# Altium footprint library ref-packages.PCBLIB: 1543 footprints (part 15 of 103)
Each footprint in its own frame and in the unit in brackets; x right, y up, seen from the top. Pads: shape width x height; smd on the part's side, far side on the other; paste and mask are expansions set on the pad; w line width, h text height; cw(c..) or ccw(c..) is an arc to the next point about the centre after c.
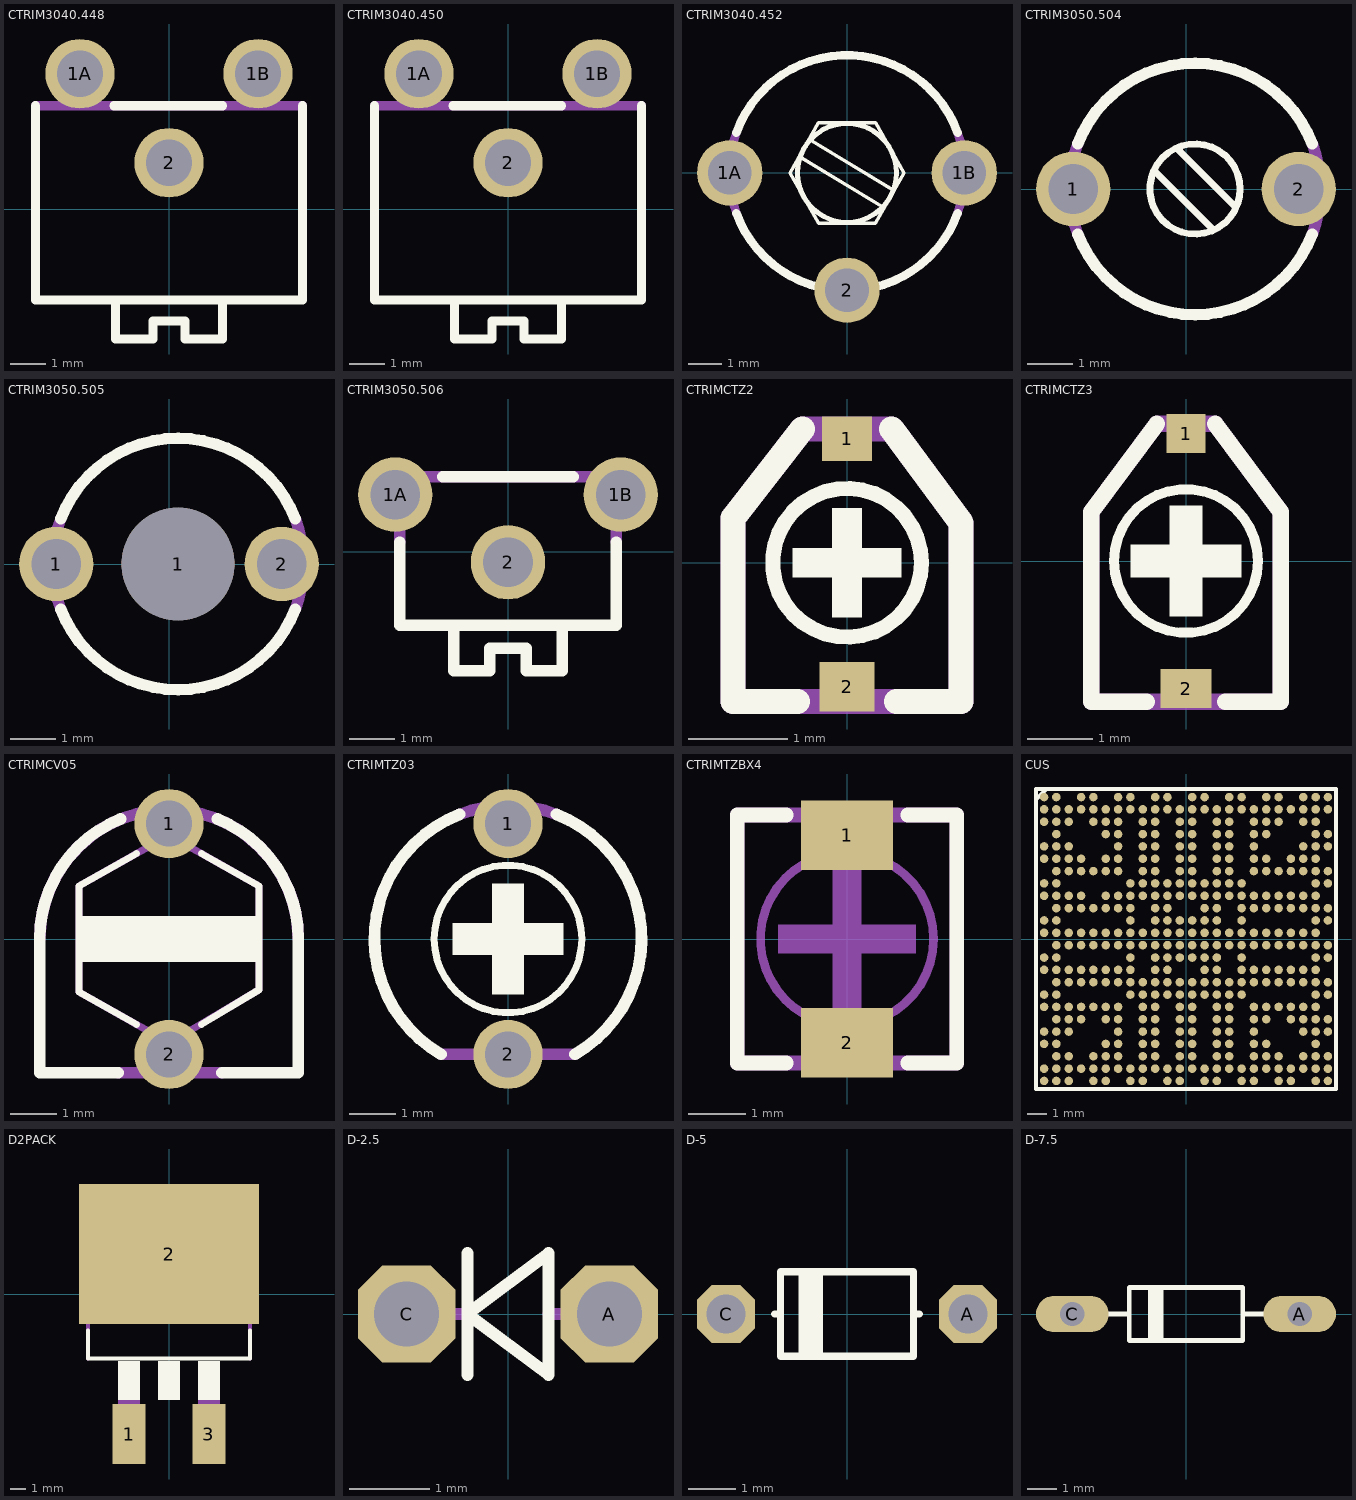
[diagram p14: the footprints below, top view; thin cyan lines are the x and y axes]

## CTRIM3040.448 [mil]
pads (3):
  round 76.77 hole 51.18: 1A(-98.43,150) 1B(98.43,150) 2(0,51.57)
Top Overlay:
  lines w10: -147.64,114.57 -147.64,-100 147.64,-100 147.64,114.57 ; -61.02,114.57 59.06,114.57 ; -59.06,-103.94 -59.06,-143.31 -17.72,-143.31 -17.72,-123.62 17.72,-123.62 17.72,-143.31 59.06,-143.31 59.06,-103.94
Mechanical 16:
  rectangle: -110.24,118.5 -86.61,179.53
  rectangle: 86.61,118.5 110.24,179.53
  lines w10: -147.64,114.57 147.64,114.57

## CTRIM3040.450 [mil]
pads (3):
  round 76.77 hole 51.18: 1A(-98.43,150) 1B(98.43,150) 2(0,51.57)
Top Overlay:
  lines w10: -147.64,114.57 -147.64,-100 147.64,-100 147.64,114.57 ; -61.02,114.57 59.06,114.57 ; -59.06,-103.94 -59.06,-143.31 -17.72,-143.31 -17.72,-123.62 17.72,-123.62 17.72,-143.31 59.06,-143.31 59.06,-103.94
Mechanical 16:
  rectangle: -110.24,118.5 -86.61,179.53
  rectangle: 86.61,118.5 110.24,179.53
  lines w10: -147.64,114.57 147.64,114.57

## CTRIM3040.452 [mil]
pads (3):
  round 76.77 hole 51.18: 1A(-137.8,0) 1B(137.8,0) 2(0,-137.8)
Top Overlay:
  circle w4: c0,0 r59.06
  circle w4: c0,0 r57.12
  lines w4: -53.15,17.72 41.34,-39.37 ; -41.34,37.4 53.15,-19.69 ; -66.93,0 -33.46,59.06 33.46,59.06 66.93,0 33.46,-59.06 -33.46,-59.06 -66.93,0
  lines w10: -129.92,-47.24 ccw(c0,0) 129.92,-47.24 ; -129.92,47.24 cw(c0,0) 129.92,47.24
Mechanical 16:
  rectangle: -153.54,-23.62 -137.8,23.62
  rectangle: 137.8,-23.62 153.54,23.62
  rectangle: -23.62,-153.54 23.62,-137.8
  lines w10: -129.92,-47.24 cw(c-0.01,0) -129.92,47.24 ; 129.92,-47.24 ccw(c0.01,0) 129.92,47.24

## CTRIM3050.504 [mil]
pads (2):
  round 64.97 hole 43.31: 1(-98.43,0) 2(98.43,0)
Top Overlay:
  circle w6: c7.87,0 r39.37
  lines w6: -27.56,15.75 23.62,-35.43 ; -7.87,35.43 43.31,-15.75
  lines w10: -94.49,-39.37 ccw(c7.88,0) 110.24,-39.37 ; -94.49,39.37 cw(c7.88,0) 110.24,39.37
Mechanical 16:
  lines w10: -94.49,-39.37 cw(c7.87,0) -94.49,39.37 ; 110.24,-39.37 ccw(c7.88,0) 110.24,39.37

## CTRIM3050.505 [mil]
pads (3):
  round 64.97 hole 43.31: 1(-98.43,0) 2(98.43,0)
  round 98.43 hole 98.43: 1(7.87,0)
Top Overlay:
  circle w6: c7.87,0 r39.37
  lines w6: -27.56,15.75 23.62,-35.43 ; -7.87,35.43 43.31,-15.75
  lines w10: -94.49,-39.37 ccw(c7.88,0) 110.24,-39.37 ; -94.49,39.37 cw(c7.88,0) 110.24,39.37
Mechanical 16:
  lines w10: -94.49,-39.37 cw(c7.87,0) -94.49,39.37 ; 110.24,-39.37 ccw(c7.88,0) 110.24,39.37

## CTRIM3050.506 [mil]
pads (3):
  round 64.97 hole 43.31: 1A(-98.43,50) 1B(98.43,50) 2(0,-9.06)
Top Overlay:
  lines w10: -94.49,8.66 -94.49,-64.17 -47.24,-64.17 ; -57.09,65.75 57.09,65.75 ; 94.49,8.66 94.49,-64.17 47.24,-64.17 ; -47.24,-64.17 -47.24,-103.54 -15.75,-103.54 -15.75,-83.86 15.75,-83.86 15.75,-103.54 47.24,-103.54 47.24,-64.17 ; -47.24,-64.17 47.24,-64.17
Mechanical 16:
  lines w10: -94.49,8.66 -94.49,65.75 94.49,65.75 94.49,8.66

## CTRIMCTZ2 [mil]
pads (2):
  rect 19.69x17.72 smd: 1(0,49.21)
  rect 21.65x19.69 smd: 2(0,-49.21)
Top Overlay:
  circle w6: c0,0 r29.53
  rectangle: -5.91,-21.65 5.91,21.65
  rectangle: -21.65,-5.91 21.65,5.91
  lines w10: -19.69,-55.12 -45.28,-55.12 -45.28,17.72 -17.72,53.15 ; 17.72,53.15 45.28,15.75 45.28,-55.12 19.69,-55.12
Mechanical 16:
  lines w10: -45.28,-55.12 -45.28,17.72 -17.72,53.15 17.72,53.15 45.28,15.75 45.28,-55.12 -45.28,-55.12

## CTRIMCTZ3 [mil]
pads (2):
  rect 23.62x23.62 smd: 1(0,76.77)
  rect 30.71x23.62 smd: 2(0,-76.77)
Top Overlay:
  circle w6: c0,0 r43.31
  rectangle: -9.84,-33.46 9.84,33.46
  rectangle: -33.46,-9.84 33.46,9.84
  lines w10: -23.62,-84.65 -57.09,-84.65 -57.09,29.53 -17.72,82.68 ; 17.72,82.68 57.09,29.53 57.09,-84.65 23.62,-84.65
Mechanical 16:
  lines w10: -57.09,-84.65 -57.09,29.53 -17.72,82.68 17.72,82.68 57.09,29.53 57.09,-84.65 -57.09,-84.65

## CTRIMCV05 [mm]
pads (2):
  round 1.5 hole 1: 1(0,2.5) 2(0,-2.5)
Top Overlay:
  rectangle: -1.9,-0.5 1.95,0.5
  lines w0.152: -0.7,-1.85 -1.95,-1.15 -1.95,1.15 -0.7,1.85 ; 0.7,-1.85 1.95,-1.1 1.95,1.15 0.7,1.85
  lines w0.254: -1.1,-2.9 -2.8,-2.9 -2.8,0 cw(c0,0.004) -1.05,2.6 ; 1.05,2.6 cw(c0,0.004) 2.8,0 2.8,-2.9 1.15,-2.9
Mechanical 16:
  lines w0.152: -1.95,-1.15 -1.95,1.15 0,2.25 1.95,1.15 1.95,-1.1 0,-2.25 -1.95,-1.15
  lines w0.254: -2.8,0 cw(c0,0) 2.8,0 ; -1.1,-2.9 1.15,-2.9

## CTRIMTZ03 [mm]
pads (2):
  round 1.5 hole 1: 1(0,2.5) 2(0,-2.5)
Top Overlay:
  circle w0.152: c0,0 r1.6
  rectangle: -0.35,-1.2 0.35,1.2
  rectangle: -1.2,-0.35 1.2,0.35
  lines w0.254: -1.45,-2.5 cw(c0,0.004) -1.05,2.7 ; 1.05,2.7 cw(c0,0.004) 1.45,-2.5
Mechanical 16:
  lines w0.254: -1.45,-2.5 1.45,-2.5 ; -1.05,2.7 cw(c0,0) 1.05,2.7

## CTRIMTZBX4 [mil]
pads (2):
  rect 62.99x47.24 smd: 1(0,70.87) 2(0,-70.87)
Top Overlay:
  lines w10: -41.34,-84.65 -74.8,-84.65 -74.8,84.65 -41.34,84.65 ; 41.34,-84.65 74.8,-84.65 74.8,84.65 41.34,84.65
Mechanical 16:
  circle w6: c0,0 r59.06
  rectangle: -9.84,-47.24 9.84,47.24
  rectangle: -47.24,-9.84 47.24,9.84
  lines w10: -74.8,-84.65 -74.8,84.65 74.8,84.65 74.8,-84.65 -74.8,-84.65

## CUS [mm]
pads (423):
  rrect100% 0.45x0.45 smd: A1(-7.475,7.475) A2(-6.825,7.475) A4(-5.525,7.475) A5(-4.875,7.475) A7(-3.575,7.475) A8(-2.925,7.475) A10(-1.625,7.475) A11(-0.975,7.475) A13(0.325,7.475) A14(0.975,7.475) A16(2.275,7.475) A17(2.925,7.475) A19(4.225,7.475) A20(4.875,7.475) A22(6.175,7.475) A23(6.825,7.475) A24(7.475,7.475) AA1(-7.475,-5.525) AA2(-6.825,-5.525) AA6(-4.225,-5.525) AA7(-3.575,-5.525) AA9(-2.275,-5.525) AA10(-1.625,-5.525) AA12(-0.325,-5.525) AA13(0.325,-5.525) AA15(1.625,-5.525) AA16(2.275,-5.525) AA18(3.575,-5.525) AA19(4.225,-5.525) AA23(6.825,-5.525) AB2(-6.825,-6.175) AB3(-6.175,-6.175) AB5(-4.875,-6.175) AB6(-4.225,-6.175) AB7(-3.575,-6.175) AB9(-2.275,-6.175) AB10(-1.625,-6.175) AB12(-0.325,-6.175) AB13(0.325,-6.175) AB15(1.625,-6.175) AB16(2.275,-6.175) AB18(3.575,-6.175) AB19(4.225,-6.175) AB20(4.875,-6.175) AB22(6.175,-6.175) AB23(6.825,-6.175) AB24(7.475,-6.175) AC1(-7.475,-6.825) AC2(-6.825,-6.825) AC3(-6.175,-6.825) AC4(-5.525,-6.825) AC5(-4.875,-6.825) AC6(-4.225,-6.825) AC7(-3.575,-6.825) AC8(-2.925,-6.825) AC9(-2.275,-6.825) AC10(-1.625,-6.825) AC11(-0.975,-6.825) AC12(-0.325,-6.825) AC13(0.325,-6.825) AC14(0.975,-6.825) AC15(1.625,-6.825) AC16(2.275,-6.825) AC17(2.925,-6.825) AC18(3.575,-6.825) AC19(4.225,-6.825) AC20(4.875,-6.825) AC21(5.525,-6.825) AC22(6.175,-6.825) AC23(6.825,-6.825) AC24(7.475,-6.825) AD1(-7.475,-7.475) AD2(-6.825,-7.475) AD3(-6.175,-7.475) AD5(-4.875,-7.475) AD6(-4.225,-7.475) AD8(-2.925,-7.475) AD9(-2.275,-7.475) AD11(-0.975,-7.475) AD12(-0.325,-7.475) AD14(0.975,-7.475) AD15(1.625,-7.475) AD17(2.925,-7.475) AD18(3.575,-7.475) AD20(4.875,-7.475) AD21(5.525,-7.475) AD23(6.825,-7.475) AD24(7.475,-7.475) B1(-7.475,6.825) B2(-6.825,6.825) B3(-6.175,6.825) B4(-5.525,6.825) B5(-4.875,6.825) B6(-4.225,6.825) B7(-3.575,6.825) B8(-2.925,6.825) B9(-2.275,6.825) B10(-1.625,6.825) B11(-0.975,6.825) B12(-0.325,6.825) B13(0.325,6.825) B14(0.975,6.825) B15(1.625,6.825) B16(2.275,6.825) B17(2.925,6.825) B18(3.575,6.825) B19(4.225,6.825) B20(4.875,6.825) B21(5.525,6.825) B22(6.175,6.825) B23(6.825,6.825) B24(7.475,6.825) C1(-7.475,6.175) C2(-6.825,6.175) C3(-6.175,6.175) C5(-4.875,6.175) C6(-4.225,6.175) C7(-3.575,6.175) C9(-2.275,6.175) C10(-1.625,6.175) C12(-0.325,6.175) C13(0.325,6.175) C15(1.625,6.175) C16(2.275,6.175) C18(3.575,6.175) C19(4.225,6.175) C20(4.875,6.175) C22(6.175,6.175) C23(6.825,6.175) D2(-6.825,5.525) D6(-4.225,5.525) D7(-3.575,5.525) D9(-2.275,5.525) D10(-1.625,5.525) D12(-0.325,5.525) D13(0.325,5.525) D15(1.625,5.525) D16(2.275,5.525) D18(3.575,5.525) D19(4.225,5.525) D23(6.825,5.525) D24(7.475,5.525) E1(-7.475,4.875) E2(-6.825,4.875) E3(-6.175,4.875) E7(-3.575,4.875) E9(-2.275,4.875) E10(-1.625,4.875) E12(-0.325,4.875) E13(0.325,4.875) E15(1.625,4.875) E16(2.275,4.875) E18(3.575,4.875) E22(6.175,4.875) E23(6.825,4.875) E24(7.475,4.875) F1(-7.475,4.225) F2(-6.825,4.225) F3(-6.175,4.225) F4(-5.525,4.225) F6(-4.225,4.225) F7(-3.575,4.225) F9(-2.275,4.225) F10(-1.625,4.225) F12(-0.325,4.225) F13(0.325,4.225) F15(1.625,4.225) F16(2.275,4.225) F18(3.575,4.225) F19(4.225,4.225) F21(5.525,4.225) F22(6.175,4.225) F23(6.825,4.225) G2(-6.825,3.575) G3(-6.175,3.575) G4(-5.525,3.575) G5(-4.875,3.575) G6(-4.225,3.575) G7(-3.575,3.575) G9(-2.275,3.575) G10(-1.625,3.575) G12(-0.325,3.575) G13(0.325,3.575) G15(1.625,3.575) G16(2.275,3.575) G18(3.575,3.575) G19(4.225,3.575) G20(4.875,3.575) G21(5.525,3.575) G22(6.175,3.575) G23(6.825,3.575) G24(7.475,3.575) H1(-7.475,2.925) H2(-6.825,2.925) H8(-2.925,2.925) H9(-2.275,2.925) H10(-1.625,2.925) H11(-0.975,2.925) H12(-0.325,2.925) H13(0.325,2.925) H14(0.975,2.925) H15(1.625,2.925) H16(2.275,2.925) H17(2.925,2.925) H23(6.825,2.925) H24(7.475,2.925) J1(-7.475,2.275) J2(-6.825,2.275) J3(-6.175,2.275) J4(-5.525,2.275) J6(-4.225,2.275) J7(-3.575,2.275) J8(-2.925,2.275) J9(-2.275,2.275) J10(-1.625,2.275) J11(-0.975,2.275) J12(-0.325,2.275) J13(0.325,2.275) J14(0.975,2.275) J15(1.625,2.275) J16(2.275,2.275) J17(2.925,2.275) J18(3.575,2.275) J19(4.225,2.275) J20(4.875,2.275) J21(5.525,2.275) J22(6.175,2.275) J23(6.825,2.275) K2(-6.825,1.625) K3(-6.175,1.625) K4(-5.525,1.625) K5(-4.875,1.625) K6(-4.225,1.625) K7(-3.575,1.625) K8(-2.925,1.625) K10(-1.625,1.625) K11(-0.975,1.625) K14(0.975,1.625) K15(1.625,1.625) K17(2.925,1.625) K18(3.575,1.625) K19(4.225,1.625) K20(4.875,1.625) K21(5.525,1.625) K22(6.175,1.625) K23(6.825,1.625) K24(7.475,1.625) L1(-7.475,0.975) L2(-6.825,0.975) L8(-2.925,0.975) L10(-1.625,0.975) L11(-0.975,0.975) L12(-0.325,0.975) L13(0.325,0.975) L14(0.975,0.975) L15(1.625,0.975) L17(2.925,0.975) L23(6.825,0.975) L24(7.475,0.975) M1(-7.475,0.325) M2(-6.825,0.325) M3(-6.175,0.325) M4(-5.525,0.325) M5(-4.875,0.325) M6(-4.225,0.325) M7(-3.575,0.325) M8(-2.925,0.325) M9(-2.275,0.325) M10(-1.625,0.325) M11(-0.975,0.325) M12(-0.325,0.325) M13(0.325,0.325) M14(0.975,0.325) M15(1.625,0.325) M16(2.275,0.325) M17(2.925,0.325) M18(3.575,0.325) M19(4.225,0.325) M20(4.875,0.325) M21(5.525,0.325) M22(6.175,0.325) M23(6.825,0.325) N2(-6.825,-0.325) N3(-6.175,-0.325) N4(-5.525,-0.325) N5(-4.875,-0.325) N6(-4.225,-0.325) N7(-3.575,-0.325) N8(-2.925,-0.325) N9(-2.275,-0.325) N10(-1.625,-0.325) N11(-0.975,-0.325) N12(-0.325,-0.325) N13(0.325,-0.325) N14(0.975,-0.325) N15(1.625,-0.325) N16(2.275,-0.325) N17(2.925,-0.325) N18(3.575,-0.325) N19(4.225,-0.325) N20(4.875,-0.325) N21(5.525,-0.325) N22(6.175,-0.325) N23(6.825,-0.325) N24(7.475,-0.325) P1(-7.475,-0.975) P2(-6.825,-0.975) P8(-2.925,-0.975) P10(-1.625,-0.975) P11(-0.975,-0.975) P12(-0.325,-0.975) P13(0.325,-0.975) P14(0.975,-0.975) P15(1.625,-0.975) P17(2.925,-0.975) P23(6.825,-0.975) P24(7.475,-0.975) R1(-7.475,-1.625) R2(-6.825,-1.625) R3(-6.175,-1.625) R4(-5.525,-1.625) R5(-4.875,-1.625) R6(-4.225,-1.625) R7(-3.575,-1.625) R8(-2.925,-1.625) R10(-1.625,-1.625) R11(-0.975,-1.625) R14(0.975,-1.625) R15(1.625,-1.625) R17(2.925,-1.625) R18(3.575,-1.625) R19(4.225,-1.625) R20(4.875,-1.625) R21(5.525,-1.625) R22(6.175,-1.625) R23(6.825,-1.625) T2(-6.825,-2.275) T3(-6.175,-2.275) T4(-5.525,-2.275) T5(-4.875,-2.275) T6(-4.225,-2.275) T7(-3.575,-2.275) T8(-2.925,-2.275) T9(-2.275,-2.275) T10(-1.625,-2.275) T11(-0.975,-2.275) T12(-0.325,-2.275) T13(0.325,-2.275) T14(0.975,-2.275) T15(1.625,-2.275) T16(2.275,-2.275) T17(2.925,-2.275) T18(3.575,-2.275) T19(4.225,-2.275) T20(4.875,-2.275) T21(5.525,-2.275) T22(6.175,-2.275) T23(6.825,-2.275) T24(7.475,-2.275) U1(-7.475,-2.925) U2(-6.825,-2.925) U8(-2.925,-2.925) U9(-2.275,-2.925) U10(-1.625,-2.925) U11(-0.975,-2.925) U12(-0.325,-2.925) U13(0.325,-2.925) U14(0.975,-2.925) U15(1.625,-2.925) U16(2.275,-2.925) U17(2.925,-2.925) U23(6.825,-2.925) U24(7.475,-2.925) V1(-7.475,-3.575) V2(-6.825,-3.575) V3(-6.175,-3.575) V4(-5.525,-3.575) V5(-4.875,-3.575) V6(-4.225,-3.575) V7(-3.575,-3.575) V9(-2.275,-3.575) V10(-1.625,-3.575) V12(-0.325,-3.575) V13(0.325,-3.575) V15(1.625,-3.575) V16(2.275,-3.575) V18(3.575,-3.575) V19(4.225,-3.575) V20(4.875,-3.575) V21(5.525,-3.575) V22(6.175,-3.575) V23(6.825,-3.575) W2(-6.825,-4.225) W3(-6.175,-4.225) W4(-5.525,-4.225) W6(-4.225,-4.225) W7(-3.575,-4.225) W9(-2.275,-4.225) W10(-1.625,-4.225) W12(-0.325,-4.225) W13(0.325,-4.225) W15(1.625,-4.225) W16(2.275,-4.225) W18(3.575,-4.225) W19(4.225,-4.225) W21(5.525,-4.225) W22(6.175,-4.225) W23(6.825,-4.225) W24(7.475,-4.225) Y1(-7.475,-4.875) Y2(-6.825,-4.875) Y3(-6.175,-4.875) Y7(-3.575,-4.875) Y9(-2.275,-4.875) Y10(-1.625,-4.875) Y12(-0.325,-4.875) Y13(0.325,-4.875) Y15(1.625,-4.875) Y16(2.275,-4.875) Y18(3.575,-4.875) Y22(6.175,-4.875) Y23(6.825,-4.875) Y24(7.475,-4.875)
Top Overlay:
  lines w0.203: -7.898,7.35 -7.898,7.898 -7.35,7.898 ; -7.898,7.35 -7.898,-7.898 7.898,-7.898 7.898,7.898 -7.35,7.898 ; -7.898,7.35 -7.35,7.898
Top Solder:
  drawing of 423 lines, arcs and shapes, not listed

## D2PACK [mil]
pads (3):
  rect 82x150 smd: 1(-100,-350) 3(100,-350)
  rect 450x350 smd: 2(0,100)
Top Overlay:
  rectangle: -128,-265 -72,-167
  rectangle: 72,-265 128,-167
  rectangle: -28,-265 28,-167
  lines w10: -202,-91 -202,-161 202,-161 202,-91
Mechanical 16:
  rectangle: -122,-375 -78,-319
  rectangle: -128,-321 -72,-265
  rectangle: 78,-375 122,-319
  rectangle: 72,-321 128,-265
  lines w10: -202,-161 -202,175 ; 202,-161 202,175 ; -202,175 -202,185 -133,229 123,229 202,175 ; -202,175 202,175

## D-2.5 [mil]
pads (2):
  oct 48x48 hole 32: A(50,0) C(-50,0)
Top Overlay:
  lines w6: -20,-30 -20,0 ; -20,30 -20,0 ; -20,0 20,30 20,-30 -20,0
Mechanical 16:
  lines w6: -50,0 -20,0 ; 20,0 50,0

## D-5 [mil]
pads (2):
  oct 48x48 hole 32: A(100,0) C(-100,0)
Top Overlay:
  rectangle: -40,-35 -20,35
  lines w6: -60,0 -55,0 ; 60,0 55,0 ; -55,0 -55,35 55,35 55,0 ; -55,0 -55,-35 55,-35 55,0

## D-7.5 [mil]
pads (2):
  oval 96x48 hole 32: A(150,0) C(-150,0)
Top Overlay:
  rectangle: -50,-35 -30,35
  lines w6: -110,0 -75,0 ; 110,0 75,0 ; -75,0 -75,35 75,35 75,0 ; -75,0 -75,-35 75,-35 75,0